# Altium footprint library 20210518.PcbLib: 414 footprints (part 25 of 26)
Each footprint in its own frame and in the unit in brackets; x right, y up, seen from the top. Pads: shape width x height; smd on the part's side, far side on the other; paste and mask are expansions set on the pad; w line width, h text height; cw(c..) or ccw(c..) is an arc to the next point about the centre after c.
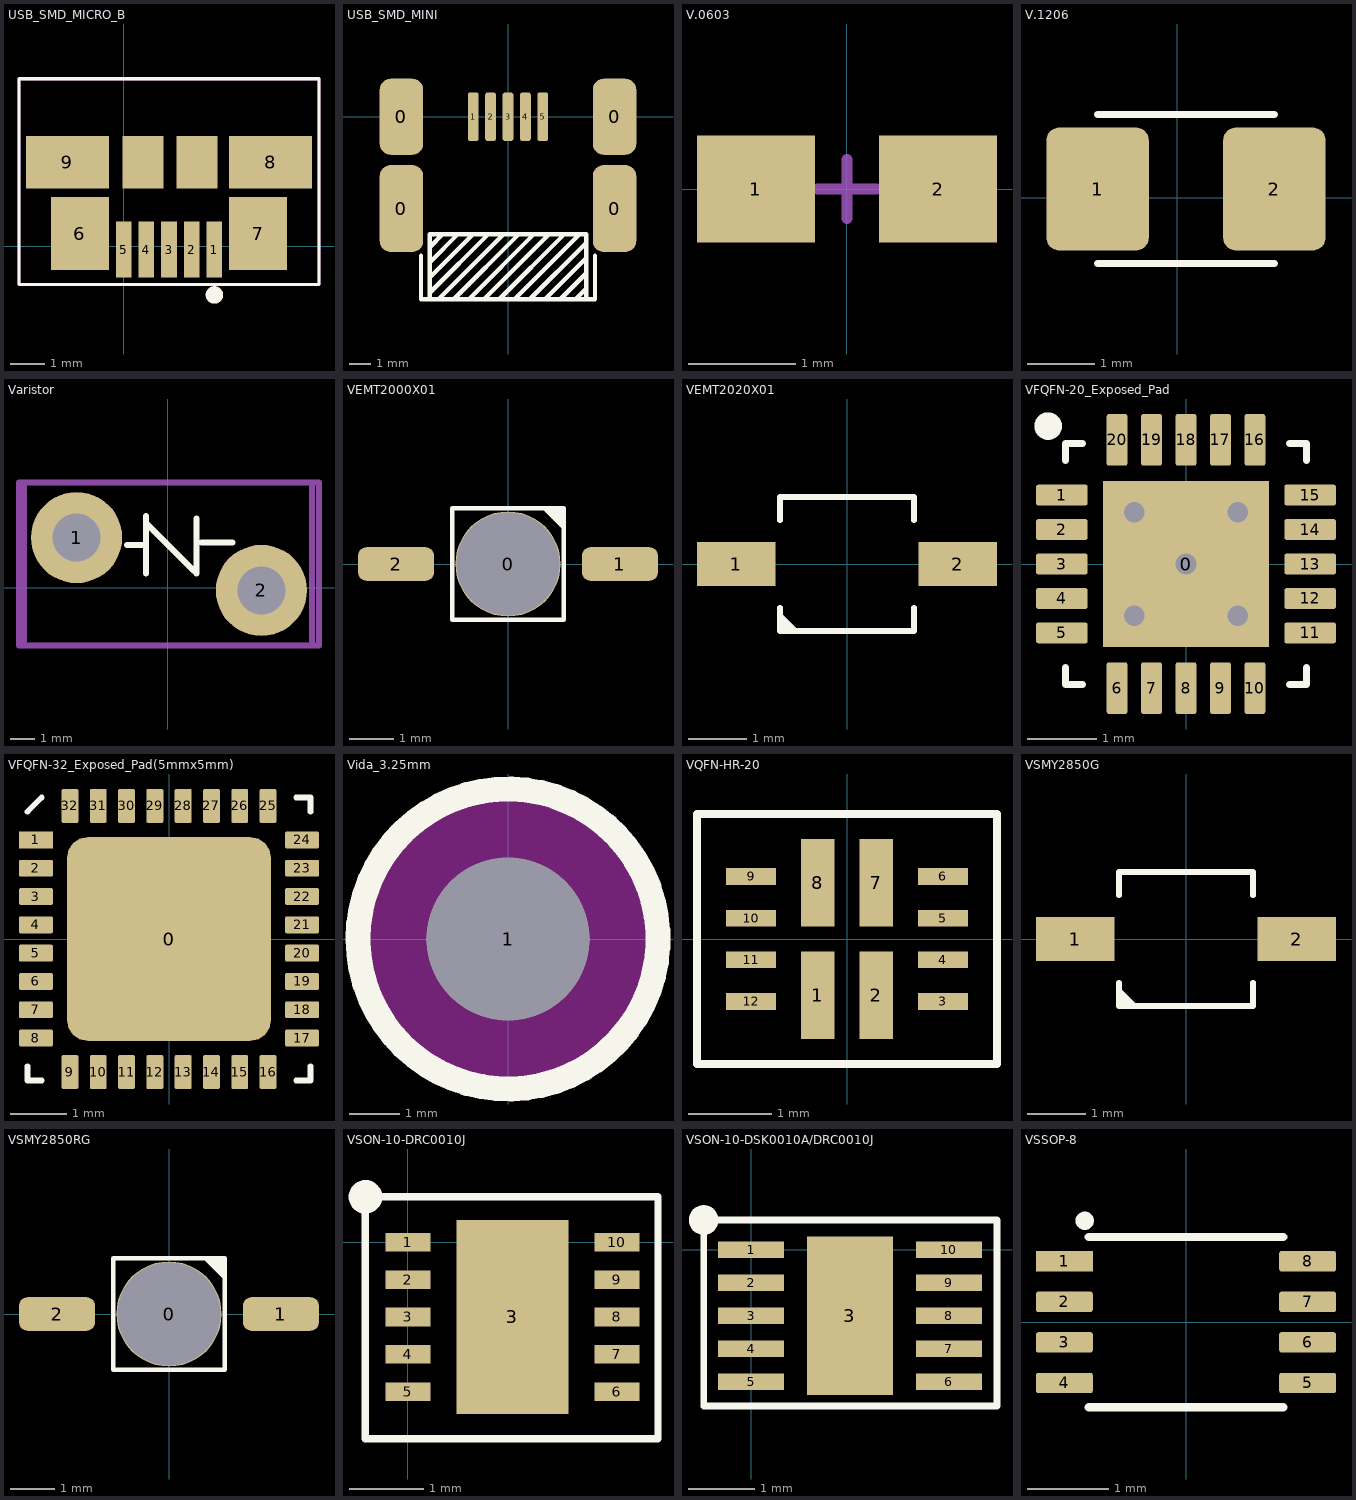
[diagram p24: the footprints below, top view; thin cyan lines are the x and y axes]

## USB_SMD_MICRO_B [mm] "Molex MicroUSB-B Footprint"
pads (11):
  rect 0.45x1.6 smd: 1(2.6,-0.1) 2(1.95,-0.1) 3(1.3,-0.1) 4(0.65,-0.1) 5(0,-0.1)
  rect 1.655x2.1 smd: 6(-1.252,0.36) 7(3.852,0.36)
  rect 2.375x1.5 smd: 8(4.212,2.4) 9(-1.612,2.4)
  rect 1.175x1.5 smd: ""(0.55,2.4) ""(2.1,2.4)
Top Overlay:
  circle w0.25: c2.6,-1.4 r0.125
  lines w0.1: -3,-1.1 5.6,-1.1 5.6,4.8 -3,4.8 -3,-1.1
Mechanical 15:
  lines w0.1: -3,-1.1 -3,4.8 5.6,4.8 5.6,-1.1 -3,-1.1
3D body: height 2.7, standoff -0.24, extent -2.69,-0.63 5.29,4.8

## USB_SMD_MINI [mm]
pads (9):
  rrect50% 2x4 smd: 0(-4.9,-4.225) 0(4.9,-4.225)
  rrect50% 2x3.5 smd: 0(-4.9,0) 0(4.9,0)
  rrect50% 0.5x2.25 smd: 1(-1.6,0) 2(-0.8,0) 3(0,0) 4(0.8,0) 5(1.6,0)
Top Overlay:
  lines w0.2: -4,-8.4 -4,-6.4 ; -3.6,-8.4 -3.6,-5.4 3.6,-5.4 3.6,-8.3 ; -3.6,-7.4 -1.6,-5.4 ; -3.6,-6 -3,-5.4 ; -3.55,-8.05 -0.9,-5.4 ; -3.2,-8.4 -0.2,-5.4 ; -2.5,-8.4 0.5,-5.4 ; -1.75,-8.35 1.2,-5.4 ; -1.1,-8.4 1.9,-5.4 ; -0.4,-8.4 2.6,-5.4 2.8,-5.4 ; 0.35,-8.35 3.3,-5.4 ; 1,-8.4 3.55,-5.85 ; 1.7,-8.4 3.6,-6.5 ; 2.4,-8.4 3.6,-7.2 ; 3.1,-8.4 3.6,-7.9 ; 4,-6.4 4,-8.4 -3.9,-8.4 ; -3.9,-8.4 -3.9,-8.4 ; -3.6,-6.7 -2.3,-5.4 -3.6,-6.7
3D body: height 4.05, standoff 0, extent -4.95,-8.5 4.95,0.5

## V.0603 [mm] "Chip varistor; Body 1.6 x 0.8 mm (LxW typ)"
height 0.85
pads (2):
  rect 1.1x1 smd: 1(-0.85,0) 2(0.85,0)
Mechanical 15:
  lines w0.1: -0.275,0 0.275,0 ; 0,-0.275 0,0.275
3D body: height 0.8, standoff 0, extent -0.8,-0.45 0.8,0.45

## V.1206 [mm] "39V 200A Varistor 1 Circuit Surface Mount, MLCV 1206 (3216 Metric)"
pads (2):
  rrect25% 1.51x1.82 smd: 1(-1.178,0.127) 2(1.432,0.127)
Top Overlay:
  lines w0.1: -1.178,-0.975 1.432,-0.975 ; -1.178,1.229 1.432,1.229
3D body: height 1.5, standoff 0, extent -1.473,-0.673 1.727,0.927

## Varistor [mm]
pads (2):
  round 3.8 hole 2: 1(-3.8,2.1) 2(3.9,-0.1)
Top Layer:
  lines w0.254: -0.9,2.3 -0.9,2.8
Top Overlay:
  lines w0.254: -1.7,1.8 -1,1.8 ; -0.9,0.6 -0.9,2.9 ; -0.9,3 -0.9,2.7 1.1,0.7 ; 1.2,0.6 1.2,2.9 ; 1.4,1.9 2.7,1.9
Mechanical 13:
  lines w0.254: -6.2,-2.4 -6.2,4.4 6.3,4.4 6.3,-2.4 -6.2,-2.4
Mechanical 15:
  lines w0.254: -6,-2.4 6,-2.4 6,4.4 -6,4.4 -6,-2.4
3D body: height 18.5, standoff -4.5, extent -8.2,-1.8 8.8,3.8

## VEMT2000X01 [mm]
pads (3):
  round 2.35 hole 2.3: 0(0,0)
  rrect50% 1.7x0.75 smd: 1(2.5,0) 2(-2.5,0)
Top Overlay:
  region: 0.75,1.25 1.25,0.75 1.25,1.25
  lines w0.1: -1.25,-1.25 1.25,-1.25 1.25,1.25 -1.25,1.25 -1.25,-1.25
3D body: height 1.65, standoff -1.11, extent -2.907,-1.15 2.907,1.15

## VEMT2020X01 [mm]
pads (2):
  rect 1.35x0.75 smd: 1(-1.9,0) 2(1.9,0)
Top Overlay:
  region: -1.15,-0.825 -0.825,-1.15 -1.15,-1.15
  lines w0.1: -1.15,-0.75 -1.15,-1.15 0.85,-1.15 1.15,-1.15 1.15,-0.75 ; -1.15,0.75 -1.15,1.15 1.15,1.15 1.15,0.75
3D body: height 2.77, standoff 0.05, extent -2.1,-1.15 2.1,1.15

## VFQFN-20_Exposed_Pad [mm]
pads (21):
  rect 2.4x2.4 smd mask-2.8: 0(0,0)
  rrect20% 0.75x0.3 smd mask+0.05: 1(-1.8,1) 2(-1.8,0.5) 3(-1.8,0) 4(-1.8,-0.5) 5(-1.8,-1) 11(1.8,-1) 12(1.8,-0.5) 13(1.8,0) 14(1.8,0.5) 15(1.8,1)
  rrect20% 0.3x0.75 smd mask+0.05: 6(-1,-1.8) 7(-0.5,-1.8) 8(0,-1.8) 9(0.5,-1.8) 10(1,-1.8) 16(1,1.8) 17(0.5,1.8) 18(0,1.8) 19(-0.5,1.8) 20(-1,1.8)
via 0.75,-0.75 diameter 0.5 hole 0.3
via 0.75,0.75 diameter 0.5 hole 0.3
via -0.75,0.75 diameter 0.5 hole 0.3
via -0.75,-0.75 diameter 0.5 hole 0.3
via 0,0 diameter 0.5 hole 0.3
Top Overlay:
  circle w0.2: c-2,2 r0.1
  lines w0.1: -1.75,-1.5 -1.75,-1.75 -1.5,-1.75 ; -1.75,1.5 -1.75,1.75 -1.5,1.75 ; 1.5,-1.75 1.75,-1.75 1.75,-1.5 ; 1.5,1.75 1.75,1.75 1.75,1.5
Top Solder:
  rectangle: -0.4,-1.15 0.4,-0.35
  rectangle: -0.4,0.35 0.4,1.15
  rectangle: 0.35,-0.4 1.15,0.4
  rectangle: -1.15,-0.4 -0.35,0.4
3D body: height 1, standoff 0, extent -1.751,-1.751 1.751,1.751

## VFQFN-32_Exposed_Pad(5mmx5mm) [mm]
pads (33):
  rrect20% 3.6x3.6 smd mask+0.05: 0(0,0)
  rect 0.6x0.3 smd mask+0.05: 1(-2.35,1.75)
  rrect20% 0.6x0.3 smd mask+0.05: 2(-2.35,1.25) 3(-2.35,0.75) 4(-2.35,0.25) 5(-2.35,-0.25) 6(-2.35,-0.75) 7(-2.35,-1.25) 8(-2.35,-1.75) 17(2.35,-1.75) 18(2.35,-1.25) 19(2.35,-0.75) 20(2.35,-0.25) 21(2.35,0.25) 22(2.35,0.75) 23(2.35,1.25) 24(2.35,1.75)
  rrect20% 0.3x0.6 smd mask+0.05: 9(-1.75,-2.35) 10(-1.25,-2.35) 11(-0.75,-2.35) 12(-0.25,-2.35) 13(0.25,-2.35) 14(0.75,-2.35) 15(1.25,-2.35) 16(1.75,-2.35) 25(1.75,2.35) 26(1.25,2.35) 27(0.75,2.35) 28(0.25,2.35) 29(-0.25,2.35) 30(-0.75,2.35) 31(-1.25,2.35) 32(-1.75,2.35)
Top Overlay:
  lines w0.1: -2.5,-2.25 -2.5,-2.5 -2.25,-2.5 ; -2.5,2.25 -2.25,2.5 ; 2.25,-2.5 2.5,-2.5 2.5,-2.25 ; 2.25,2.5 2.5,2.5 2.5,2.25
3D body: height 1.01, standoff 0, extent -2.56,-2.56 2.56,2.56

## Vida_3.25mm [mm]
pads (1):
  round 3.25 hole 3.25: 1(0,0)
Top Overlay:
  lines w0.5: 2.996,0.162 ccw(c0,0) 2.997,0.14
Keep-Out Layer:
  circle w6.2: c0,0 r0.001
Mechanical 13:
  circle w0.2: c0,0 r3
Mechanical 15:
  circle w0.2: c0,0 r3

## VQFN-HR-20 [mm] "TPS2121 (RUX) Package 12-Pin VQFN-HR"
pads (12):
  rect 0.4x1.05 smd: 1(-0.35,-0.675) 2(0.35,-0.675) 7(0.35,0.675) 8(-0.35,0.675)
  rect 0.6x0.2 smd: 3(1.15,-0.75) 4(1.15,-0.25) 5(1.15,0.25) 6(1.15,0.75) 9(-1.15,0.75) 10(-1.15,0.25) 11(-1.15,-0.25) 12(-1.15,-0.75)
Top Overlay:
  lines w0.1: -1.8,-1.5 -1.8,1.5 1.8,1.5 1.8,-1.5 -1.8,-1.5
3D body: height 1, standoff 1, extent -1.3,-1.05 0,0.005
3D body: height 1, standoff 0, extent -1.3,-1.05 1.3,1.06

## VSMY2850G [mm]
pads (2):
  rect 1.35x0.75 smd: 1(-1.9,0) 2(1.9,0)
Top Overlay:
  region: -1.15,-0.825 -0.825,-1.15 -1.15,-1.15
  lines w0.1: -1.15,-0.75 -1.15,-1.15 0.85,-1.15 1.15,-1.15 1.15,-0.75 ; -1.15,0.75 -1.15,1.15 1.15,1.15 1.15,0.75
3D body: height 2.77, standoff 0.05, extent -2.1,-1.15 2.1,1.15

## VSMY2850RG [mm]
pads (3):
  round 2.35 hole 2.3: 0(0,0)
  rrect50% 1.7x0.75 smd: 1(2.5,0) 2(-2.5,0)
Top Overlay:
  region: 0.75,1.25 1.25,0.75 1.25,1.25
  lines w0.1: -1.25,-1.25 -1.25,1.25 1.25,1.25 1.25,-1.25 -1.25,-1.25
3D body: height 1.65, standoff -1.11, extent -2.907,-1.15 2.907,1.15

## VSON-10-DRC0010J [mm] "3 mm x 3 mm"
height 1
pads (11):
  rect 0.6x0.25 smd: 1(0,0) 2(0,-0.5) 3(0,-1) 4(0,-1.5) 5(0,-2) 6(2.8,-2) 7(2.8,-1.5) 8(2.8,-1) 9(2.8,-0.5) 10(2.8,0)
  rect 1.5x2.6 smd paste-3: 3(1.4,-1)
Top Overlay:
  circle w0.25: c-0.57,0.61 r0.1
  lines w0.1: -0.57,-2.63 -0.57,0.61 3.35,0.61 3.35,-2.63 -0.57,-2.63
3D body: height 1, standoff 0, extent -0.1,-2.5 2.9,0.5

## VSON-10-DSK0010A/DRC0010J [mm] "3 mm x 3 mm"
height 1
pads (11):
  rect 1x0.25 smd: 1(0,0) 2(0,-0.5) 3(0,-1) 4(0,-1.5) 5(0,-2) 6(3,-2) 7(3,-1.5) 8(3,-1) 9(3,-0.5) 10(3,0)
  rect 1.3x2.4 smd paste-3: 3(1.5,-1)
Top Overlay:
  circle w0.25: c-0.72,0.45 r0.1
  lines w0.1: -0.72,-2.37 -0.72,0.45 3.73,0.45 3.73,-2.37 -0.72,-2.37
3D body: height 0.77, standoff 0, extent 0.25,-2.25 2.75,0.25

## VSSOP-8 [mm]
pads (8):
  rect 0.7x0.25 smd: 1(-1.5,0.75)
  rrect20% 0.7x0.25 smd: 2(-1.5,0.25) 3(-1.5,-0.25) 4(-1.5,-0.75) 5(1.5,-0.75) 6(1.5,-0.25) 7(1.5,0.25) 8(1.5,0.75)
Top Overlay:
  circle w0.125: c-1.25,1.25 r0.05
  lines w0.1: -1.2,-1.05 1.2,-1.05 ; -1.2,1.05 1.2,1.05
3D body: height 0.9, standoff 0, extent -1.6,-1.05 1.6,1.05